# Altium footprint library Connectors SMD.PcbLib: 130 footprints (part 3 of 12)
Each footprint in its own frame and in the unit in brackets; x right, y up, seen from the top. Pads: shape width x height; smd on the part's side, far side on the other; paste and mask are expansions set on the pad; w line width, h text height; cw(c..) or ccw(c..) is an arc to the next point about the centre after c.
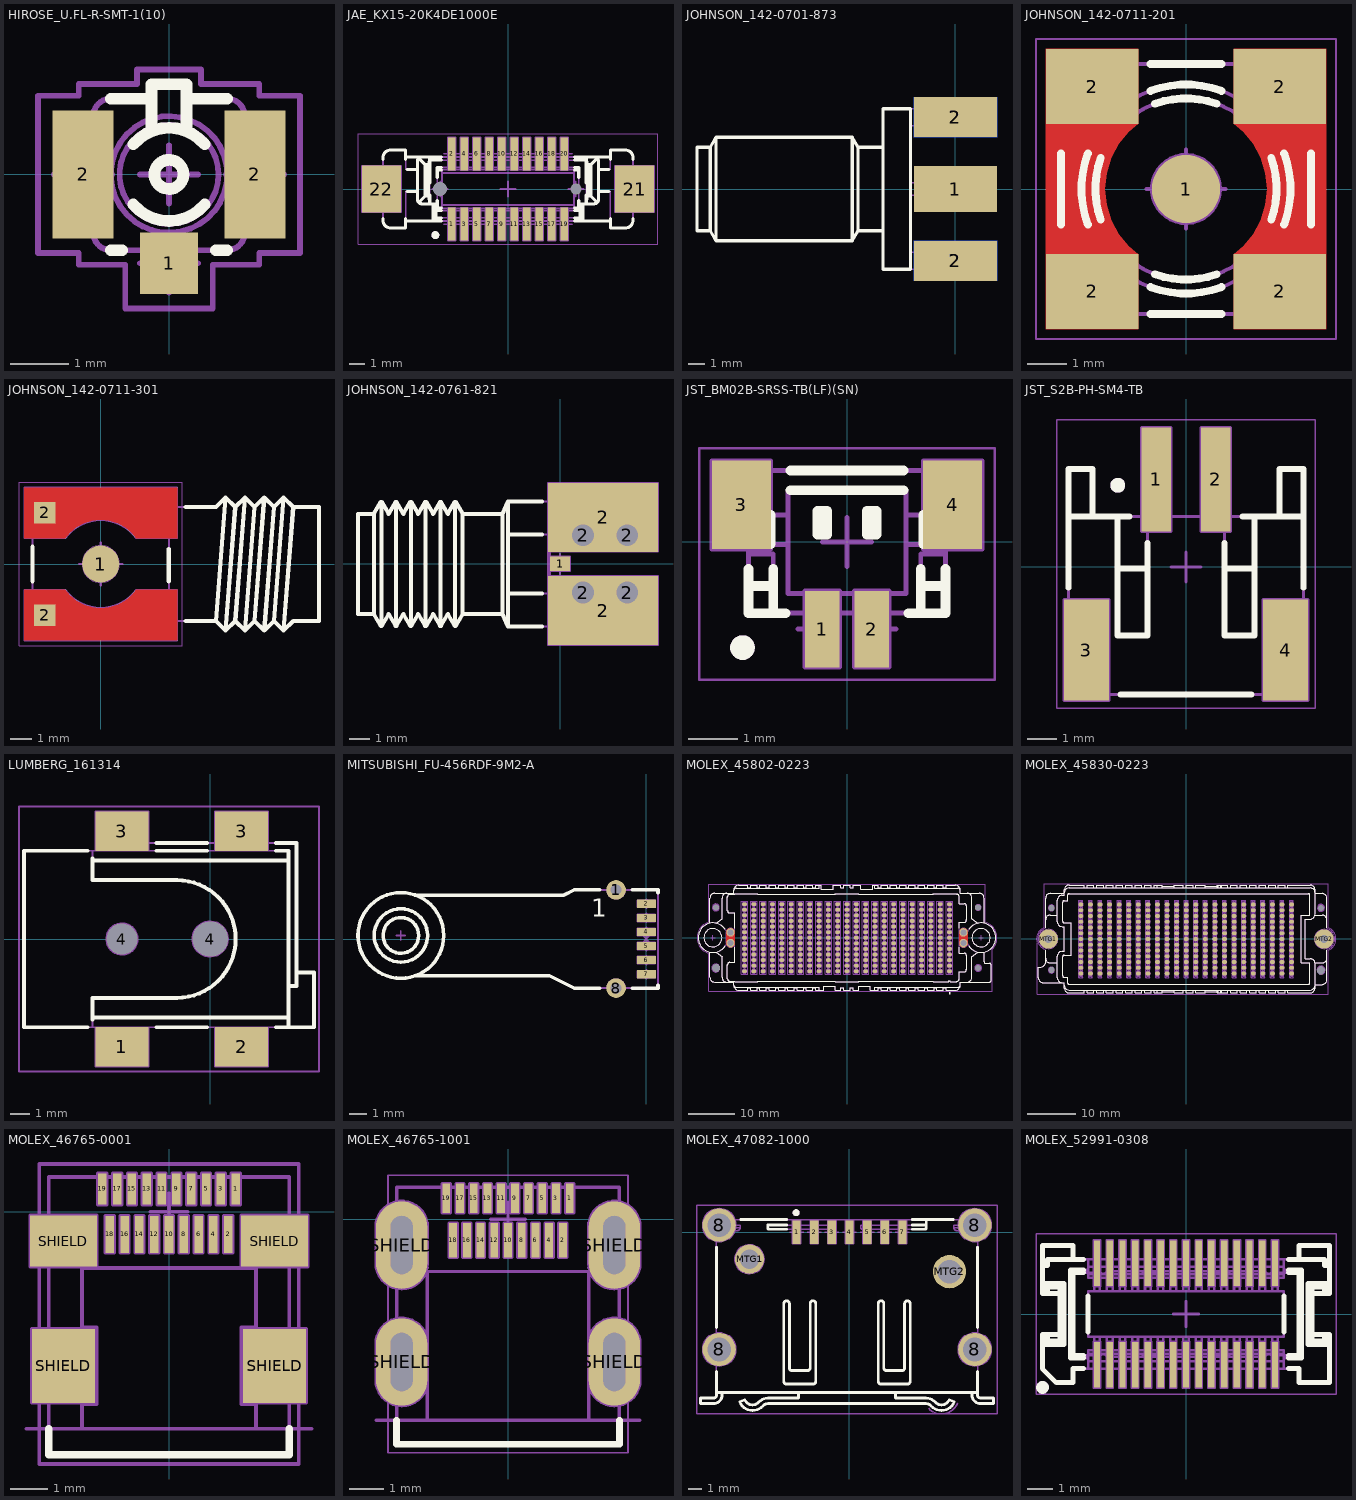
[diagram p2: the footprints below, top view; thin cyan lines are the x and y axes]

## HIROSE_U.FL-R-SMT-1(10) [mm] "Up to 6GHz Ultra Small Surface Mount Male Coaxial Connectors U.FL Series"
height 1.25
pads (3):
  rect 1x1.05 smd: 1(0,-1.525)
  rect 1.05x2.2 smd: 2(-1.475,0) 2(1.475,0)
Top Overlay:
  circle w0.2: c0,0 r0.25
  lines w0.2: -1,-1.3 -0.8,-1.3 ; -1,1.3 -0.3,1.3 ; -0.612,-0.516 ccw(c0,0) 0.612,-0.516 ; -0.612,0.516 cw(c0,0) 0.612,0.516 ; -0.3,0.75 -0.3,1.55 0.3,1.55 0.3,0.75 ; 0.3,1.3 1,1.3 ; 0.8,-1.3 1,-1.3
Mechanical 8:
  lines w0.1: -1.975,0 -1.475,0 ; -1.475,-0.5 -1.475,0 ; -1.475,0.5 -1.475,0 ; -0.975,0 -1.475,0 ; -0.5,-1.525 0,-1.525 ; -0.5,0 0,0 ; 0,-2.025 0,-1.525 ; 0,-1.025 0,-1.525 ; 0,-0.5 0,0 ; 0,0.5 0,0 ; 0.5,-1.525 0,-1.525 ; 0.5,0 0,0 ; 0.975,0 1.475,0 ; 1.475,-0.5 1.475,0 ; 1.475,0.5 1.475,0 ; 1.975,0 1.475,0
Mechanical 14:
  circle w0.1: c0,0 r1
  circle w0.1: c0,0 r0.85
  circle w0.1: c0,0 r0.25
  lines w0.1: -1.3,-0.9 -1.5,-0.9 -1.5,0.9 -1.3,0.9 ; -0.3,-1.3 -0.3,-1.55 0.3,-1.55 0.3,-1.3 ; -0.3,0.954 -0.3,1.55 0.3,1.55 0.3,0.954 ; -0.3,1.3 -1,1.3 ccw(c-1,1) -1.3,1 -1.3,-1 ccw(c-1,-1) -1,-1.3 1,-1.3 ccw(c1,-1) 1.3,-1 1.3,1 ccw(c1,1) 1,1.3 0.3,1.3 ; 1.3,-0.9 1.5,-0.9 1.5,0.9 1.3,0.9
Mechanical 15:
  lines w0.1: 0.75,1.55 1.55,1.55 ; 1.55,1.55 0.55,1.55 0.55,1.8 -0.55,1.8 -0.55,1.55 -1.55,1.55 -1.55,1.35 -2.25,1.35 -2.25,-1.35 -1.55,-1.35 -1.55,-1.55 -0.75,-1.55 -0.75,-2.3 0.75,-2.3 0.75,-1.55 1.55,-1.55 1.55,-1.35 2.25,-1.35 2.25,1.35 1.55,1.35 1.55,1.55
3D body: height 1.25, standoff 0, extent -1.5,-1.55 1.5,1.55

## JAE_KX15-20K4DE1000E [mm] "0.8mm Pitch, 20 Contacts Surface Mount Board to Board & Mezzanine Plug Connector"
height 6.05
pads (24):
  rect 0.5x2.1 smd: 1(-3.6,-2.25) 2(-3.6,2.25) 3(-2.8,-2.25) 4(-2.8,2.25) 5(-2,-2.25) 6(-2,2.25) 7(-1.2,-2.25) 8(-1.2,2.25) 9(-0.4,-2.25) 10(-0.4,2.25) 11(0.4,-2.25) 12(0.4,2.25) 13(1.2,-2.25) 14(1.2,2.25) 15(2,-2.25) 16(2,2.25) 17(2.8,-2.25) 18(2.8,2.25) 19(3.6,-2.25) 20(3.6,2.25)
  rect 2.5x3 smd: 21(8.1,0) 22(-8.1,0)
  round 0.5 hole 0.7 unplated mask+0.1: 23(4.35,0)
  round 0.5 hole 0.9 unplated mask+0.2: 24(-4.35,0)
Top Overlay:
  circle w0.25: c-4.65,-2.95 r0.125
  lines w0.2: -8,-1.9 -8,-2 ccw(c-7.5,-2) -7.5,-2.5 -6.55,-2.5 -6.55,-1.9 ; -8,1.9 -8,2 cw(c-7.5,2) -7.5,2.5 -6.55,2.5 -6.55,1.9 ; -6.55,-2.05 -4.25,-2.05 ; -6.55,2.05 -4.25,2.05 ; -6.45,-0.15 -5.8,-0.15 ; -6.45,1.25 -5.8,1.25 ; -5.712,-0.862 -5.3,-0.45 ; -5.712,1.962 -5.3,1.55 ; -5.5,2.05 ccw(c-5.5,1.75) -5.8,1.75 -5.8,-0.65 ccw(c-5.5,-0.65) -5.5,-0.95 -4.6,-0.95 -4.6,-1.85 ; -5,-0.374 -5,-0.95 -5.1,-0.45 ; -5,0.374 -5,1.85 ; -5,2.05 -5.1,1.55 ; -4.96,2.05 -5,1.85 ; -4.8,-0.95 -4.8,-2.05 -4.6,-1.85 ; -4.525,-0.729 -4.525,-1.375 ; -4.525,0.729 -4.525,1.375 ; -4.25,-1.85 -4.6,-1.85 ; -4.25,-1.375 -4.525,-1.375 ; -4.25,-1.225 -4.502,-1.225 -4.525,-1.375 ; -4.25,1.225 -4.502,1.225 -4.525,1.375 ; -4.25,1.375 -4.525,1.375 ; -4.25,1.85 -5,1.85 ; 4.25,-2.05 6.55,-2.05 ; 4.25,-1.85 4.6,-1.85 ; 4.25,-1.375 4.525,-1.375 ; 4.25,-1.225 4.502,-1.225 4.525,-1.375 ; 4.25,1.225 4.502,1.225 4.525,1.375 ; 4.25,1.375 4.525,1.375 ; 4.25,1.85 5,1.85 ; 4.25,2.05 6.55,2.05 ; 4.525,-0.729 4.525,-1.375 ; 4.525,0.729 4.525,1.375 ; 4.8,-0.95 4.8,-2.05 4.6,-1.85 ; 4.96,2.05 5,1.85 ; 5,-0.374 5,-0.95 5.1,-0.45 ; 5,0.374 5,1.85 ; 5,2.05 5.1,1.55 ; 5.476,2.049 cw(c5.5,1.75) 5.8,1.75 5.8,-0.65 cw(c5.5,-0.65) 5.5,-0.95 4.6,-0.95 4.6,-1.85 ; 5.712,-0.862 5.3,-0.45 ; 5.712,1.962 5.3,1.55 ; 5.8,-0.15 6.45,-0.15 ; 5.8,1.25 6.45,1.25 ; 6.55,-1.9 6.55,-2.5 7.5,-2.5 ccw(c7.5,-2) 8,-2 8,-1.9 ; 6.55,1.9 6.55,2.5 7.5,2.5 cw(c7.5,2) 8,2 8,1.9 ; -5.3,-0.45 -5.3,1.55 ; -5.3,-0.45 -5.1,-0.45 ; -5.3,1.55 -5.1,1.55 ; -5.1,-0.45 -5.1,1.55 ; 5.1,-0.45 5.1,1.55 ; 5.1,-0.45 5.3,-0.45 ; 5.1,1.55 5.3,1.55 ; 5.3,-0.45 5.3,1.55
Mechanical 8:
  drawing of 192 lines, arcs and shapes, not listed
Mechanical 14:
  circle w0.25: c-4.65,-2.95 r0.125
  lines w0.1: -8,-0.95 -8.7,-0.95 -8.7,0.95 -8,0.95 ; -6.55,-2.05 6.55,-2.05 ; -6.55,2.05 6.55,2.05 ; -5.8,-0.15 -6.55,-0.15 -6.55,-2.5 -7.5,-2.5 cw(c-7.5,-2) -8,-2 -8,2 cw(c-7.5,2) -7.5,2.5 -6.55,2.5 -6.55,1.25 -5.8,1.25 ; -5.712,-0.862 -5.3,-0.45 ; -5.712,1.962 -5.3,1.55 ; -5.5,2.05 ccw(c-5.5,1.75) -5.8,1.75 -5.8,-0.65 ccw(c-5.5,-0.65) -5.5,-0.95 -4.6,-0.95 -4.6,-1.85 ; -5,2.05 -5.1,1.55 ; -4.96,2.05 -5,1.85 ; -4.8,-0.95 -4.8,-2.05 -4.6,-1.85 ; -4.225,-1.225 -4.225,1.225 ; -4.225,-1.025 4.225,-1.025 ; -4.225,1.025 4.225,1.025 ; -3.725,-2.05 -3.725,-2.75 -3.475,-2.75 -3.475,-2.05 ; -3.725,2.05 -3.725,2.75 -3.475,2.75 -3.475,2.05 ; -2.925,-2.05 -2.925,-2.75 -2.675,-2.75 -2.675,-2.05 ; -2.925,2.05 -2.925,2.75 -2.675,2.75 -2.675,2.05 ; -2.125,-2.05 -2.125,-2.75 -1.875,-2.75 -1.875,-2.05 ; -2.125,2.05 -2.125,2.75 -1.875,2.75 -1.875,2.05 ; -1.325,-2.05 -1.325,-2.75 -1.075,-2.75 -1.075,-2.05 ; -1.325,2.05 -1.325,2.75 -1.075,2.75 -1.075,2.05 ; -0.525,-2.05 -0.525,-2.75 -0.275,-2.75 -0.275,-2.05 ; -0.525,2.05 -0.525,2.75 -0.275,2.75 -0.275,2.05 ; 0.275,-2.05 0.275,-2.75 0.525,-2.75 0.525,-2.05 ; 0.275,2.05 0.275,2.75 0.525,2.75 0.525,2.05 ; 1.075,-2.05 1.075,-2.75 1.325,-2.75 1.325,-2.05 ; 1.075,2.05 1.075,2.75 1.325,2.75 1.325,2.05 ; 1.875,-2.05 1.875,-2.75 2.125,-2.75 2.125,-2.05 ; 1.875,2.05 1.875,2.75 2.125,2.75 2.125,2.05 ; 2.675,-2.05 2.675,-2.75 2.925,-2.75 2.925,-2.05 ; 2.675,2.05 2.675,2.75 2.925,2.75 2.925,2.05 ; 3.475,-2.05 3.475,-2.75 3.725,-2.75 3.725,-2.05 ; 3.475,2.05 3.475,2.75 3.725,2.75 3.725,2.05 ; 4.225,-1.225 4.225,1.225 ; 4.8,-0.95 4.8,-2.05 4.6,-1.85 ; 4.96,2.05 5,1.85 ; 5,2.05 5.1,1.55 ; 5.476,2.049 cw(c5.5,1.75) 5.8,1.75 5.8,-0.65 cw(c5.5,-0.65) 5.5,-0.95 4.6,-0.95 4.6,-1.85 ; 5.712,-0.862 5.3,-0.45 ; 5.712,1.962 5.3,1.55 ; 5.8,-0.15 6.55,-0.15 6.55,-2.5 7.5,-2.5 ccw(c7.5,-2) 8,-2 8,2 ccw(c7.5,2) 7.5,2.5 6.55,2.5 6.55,1.25 5.8,1.25 ; 8,-0.95 8.7,-0.95 8.7,0.95 8,0.95 ; -5.3,-0.45 -5.3,1.55 ; -5.3,-0.45 -5.1,-0.45 ; -5.3,1.55 -5.1,1.55 ; -5.1,-0.45 -5,-0.95 -5,1.85 ; -5.1,-0.45 -5.1,1.55 ; -5,1.85 5,1.85 ; -4.6,-1.85 4.6,-1.85 ; -4.525,-1.375 -4.502,-1.225 4.502,-1.225 4.525,-1.375 ; -4.525,-1.375 4.525,-1.375 ; -4.525,-1.375 -4.525,1.375 ; -4.525,1.375 -4.502,1.225 4.502,1.225 4.525,1.375 ; -4.525,1.375 4.525,1.375 ; 4.525,-1.375 4.525,1.375 ; 5,1.85 5,-0.95 5.1,-0.45 ; 5.1,-0.45 5.1,1.55 ; 5.1,-0.45 5.3,-0.45 ; 5.1,1.55 5.3,1.55 ; 5.3,-0.45 5.3,1.55
Mechanical 15:
  lines w0.05: -9.6,-3.55 -9.6,3.55 9.6,3.55 9.6,-3.55 -9.6,-3.55
3D body: height 5.75, standoff -0.6, extent -8.7,-2.75 8.7,2.75

## JOHNSON_142-0701-873 [mm] "SMA End Launch Straight Bulkhead Jack Receptacle - Round Contact"
height 8.05
pads (5):
  rect 5x2.794 smd: 1(0,0)
  rect 5x2.4 smd: 2(0,-4.317) 2(0,4.317)
  rect 5x2.4 smd far side: 2(0,-4.317) 2(0,4.317)
Top Overlay:
  lines w0.2: -14.73,-2.5 -15.526,-2.5 -15.526,2.5 -14.73,2.5 ; -5.85,-2.5 -4.35,-2.5 ; -5.85,2.5 -4.35,2.5 ; -14.38,-3.11 -6.2,-3.11 ; -14.38,-3.11 -14.73,-2.51 -14.73,2.51 -14.38,3.11 ; -14.38,-3.11 -14.38,3.11 ; -14.38,3.11 -6.2,3.11 ; -6.2,-3.11 -5.85,-2.51 -5.85,2.51 -6.2,3.11 ; -6.2,-3.11 -6.2,3.11 ; -4.35,-4.825 -4.35,4.825 -2.7,4.825 -2.7,-4.825 -4.35,-4.825
Mechanical 8:
  lines w0.1: -1,-4.317 0,-4.317 ; -1,0 0,0 ; -1,4.317 0,4.317 ; 0,-5.317 0,-4.317 ; 0,-3.317 0,-4.317 ; 0,-1 0,0 ; 0,1 0,0 ; 0,3.317 0,4.317 ; 0,5.317 0,4.317 ; 1,-4.317 0,-4.317 ; 1,0 0,0 ; 1,4.317 0,4.317
Mechanical 14:
  lines w0.1: -14.73,-2.5 -15.526,-2.5 -15.526,2.5 -14.73,2.5 ; -5.85,-2.5 -4.35,-2.5 ; -5.85,2.5 -4.35,2.5 ; -2.7,-3.809 2.05,-3.809 2.05,-4.825 -2.7,-4.825 ; -2.7,-0.381 2.054,-0.381 2.054,0.381 -2.696,0.381 ; -2.7,3.809 2.05,3.809 2.05,4.825 -2.7,4.825 ; -14.38,-3.11 -6.2,-3.11 ; -14.38,-3.11 -14.73,-2.51 -14.73,2.51 -14.38,3.11 ; -14.38,-3.11 -14.38,3.11 ; -14.38,3.11 -6.2,3.11 ; -6.2,-3.11 -5.85,-2.51 -5.85,2.51 -6.2,3.11 ; -6.2,-3.11 -6.2,3.11 ; -2.7,-4.825 -4.35,-4.825 -4.35,4.825 -2.7,4.825 ; -2.7,-4.825 -2.7,4.825
3D body: height 4.48, standoff -3.57, extent -15.526,-4.825 2.054,4.825
3D body: height 5.56, standoff -4.64, extent -8.57,-5.1 -6.35,5.1

## JOHNSON_142-0711-201 [mm] "SMA 50 Ohm Straight Jack Receptacle - Surface Mount"
height 8.84
pads (5):
  round 1.73 smd: 1(0,0)
  rect 2.35x1.9 smd: 2(-2.38,-2.6) 2(-2.38,2.6) 2(2.38,-2.6) 2(2.38,2.6)
Top Layer:
  region: 1.205,-3.555 3.555,-3.555 3.555,3.555 1.205,3.555 1.207,1.655 1.453,1.453 1.709,1.142 1.898,0.786 2.015,0.401 2.055,0 2.015,-0.401 1.898,-0.786 1.709,-1.142 1.453,-1.453 1.207,-1.655 1.205,-1.652
  region: -3.555,-3.555 -1.205,-3.555 -1.207,-1.655 -1.453,-1.453 -1.709,-1.142 -1.898,-0.786 -2.015,-0.401 -2.055,0 -2.015,0.401 -1.898,0.786 -1.709,1.142 -1.453,1.453 -1.207,1.655 -1.205,1.652 -1.205,3.555 -3.555,3.555
Top Overlay:
  lines w0.2: -3.175,-0.905 -3.175,0.905 ; -2.491,-0.905 cw(c0,0) -2.491,0.905 ; -2.162,-0.78 cw(c0,0.005) -2.162,0.79 ; -0.905,-3.175 0.905,-3.175 ; -0.905,-2.491 ccw(c0,0) 0.905,-2.491 ; -0.905,2.491 cw(c0,0) 0.905,2.491 ; -0.905,3.175 0.905,3.175 ; -0.79,-2.162 ccw(c-0.005,0) 0.78,-2.162 ; -0.79,2.162 cw(c-0.005,0) 0.78,2.162 ; 2.162,-0.78 ccw(c0,0.005) 2.162,0.79 ; 2.491,-0.905 ccw(c0,0) 2.491,0.905 ; 3.175,-0.905 3.175,0.905
Top Solder:
  region: -3.655,-3.655 -3.655,-1.105 -1.601,-1.105 -1.606,-1.109 -1.382,-1.382 -1.109,-1.606 -1.105,-1.601 -1.105,-3.655
  region: 1.105,-3.655 1.105,-1.601 1.109,-1.606 1.382,-1.382 1.606,-1.109 1.601,-1.105 3.655,-1.105 3.655,-3.655
  region: -3.655,1.105 -1.601,1.105 -1.606,1.109 -1.382,1.382 -1.109,1.606 -1.105,1.601 -1.105,3.655 -3.655,3.655
  region: 1.109,1.606 1.382,1.382 1.606,1.109 1.601,1.105 3.655,1.105 3.655,3.655 1.105,3.655
Mechanical 8:
  lines w0.1: -3.38,-2.38 -2.38,-2.38 ; -3.38,2.38 -2.38,2.38 ; -2.38,-3.38 -2.38,-2.38 ; -2.38,-1.38 -2.38,-2.38 ; -2.38,1.38 -2.38,2.38 ; -2.38,3.38 -2.38,2.38 ; -1.38,-2.38 -2.38,-2.38 ; -1.38,2.38 -2.38,2.38 ; -1,0 0,0 ; 0,-1 0,0 ; 0,1 0,0 ; 1,0 0,0 ; 1.38,-2.38 2.38,-2.38 ; 1.38,2.38 2.38,2.38 ; 2.38,-3.38 2.38,-2.38 ; 2.38,-1.38 2.38,-2.38 ; 2.38,1.38 2.38,2.38 ; 2.38,3.38 2.38,2.38 ; 3.38,-2.38 2.38,-2.38 ; 3.38,2.38 2.38,2.38 ; -3.175,-3.175 -3.175,-1.585 -1.585,-1.585 -1.585,-3.175 -3.175,-3.175 ; -3.175,1.585 -3.175,3.175 -1.585,3.175 -1.585,1.585 -3.175,1.585 ; 1.585,-3.175 3.175,-3.175 3.175,-1.585 1.585,-1.585 1.585,-3.175 ; 1.585,1.585 3.175,1.585 3.175,3.175 1.585,3.175 1.585,1.585
Mechanical 14:
  circle w0.1: c0,0 r0.635
  circle w0.1: c0,0 r2.65
  circle w0.1: c0,0 r2.3
  lines w0.1: 3.175,-3.175 -3.175,-3.175 -3.175,3.175 3.175,3.175 ; 3.175,-3.175 3.175,3.175 ; 3.175,-3.175 3.175,3.175
Mechanical 15:
  circle w0.1: c0,0 r0.865
  lines w0.05: -3.805,-3.805 -3.805,3.805 3.805,3.805 3.805,-3.805 -3.805,-3.805
3D body: height 8.84, standoff 0, extent -3.175,-3.175 3.175,3.175

## JOHNSON_142-0711-301 [mm] "SMA 50 Ohm Right Angle Jack Receptacle - Surface Mount"
height 8.26
pads (3):
  round 1.73 smd: 1(0,0)
  rect 1x1 smd: 2(-2.6,-2.38) 2(-2.6,2.38)
Top Layer:
  region: 3.555,-3.555 3.555,-1.205 1.655,-1.207 1.453,-1.453 1.142,-1.709 0.786,-1.898 0.401,-2.015 0,-2.055 -0.401,-2.015 -0.786,-1.898 -1.142,-1.709 -1.453,-1.453 -1.655,-1.207 -1.652,-1.205 -3.555,-1.205 -3.555,-3.555
  region: 3.555,1.205 3.555,3.555 -3.555,3.555 -3.555,1.205 -1.655,1.207 -1.453,1.453 -1.142,1.709 -0.786,1.898 -0.401,2.015 0,2.055 0.401,2.015 0.786,1.898 1.142,1.709 1.453,1.453 1.655,1.207 1.652,1.205
Top Overlay:
  lines w0.2: -3.175,-0.805 -3.175,0.805 ; 3.175,-0.805 3.175,0.7 ; 3.955,-2.65 5.365,-2.65 ; 3.955,2.65 5.365,2.65 5.815,3.1 ; 5.365,-2.65 5.815,-3.1 ; 5.365,-2.65 5.815,3.1 ; 5.815,-3.1 6.265,-2.65 ; 5.815,-3.1 6.265,2.65 ; 5.815,3.1 6.265,2.65 ; 6.265,-2.65 6.715,-3.1 ; 6.265,-2.65 6.715,3.1 ; 6.265,2.65 6.715,3.1 ; 6.715,-3.1 7.165,-2.65 ; 6.715,-3.1 7.165,2.65 ; 6.715,3.1 7.165,2.65 ; 7.165,-2.65 7.615,-3.1 ; 7.165,-2.65 7.615,3.1 ; 7.165,2.65 7.615,3.1 ; 7.615,-3.1 8.065,-2.65 ; 7.615,-3.1 8.065,2.65 ; 7.615,3.1 8.065,2.65 ; 8.065,-2.65 8.515,-3.1 ; 8.065,-2.65 8.515,3.1 ; 8.065,2.65 8.515,3.1 ; 8.515,-3.1 8.965,-2.65 10.165,-2.65 10.165,2.65 8.965,2.65 ; 8.515,-3.1 8.965,2.65 ; 8.515,3.1 8.965,2.65
Mechanical 7:
  lines w0.1: -3.555,-3.555 -3.555,-1.205 -1.652,-1.205 ccw(c0,0) 1.652,-1.205 3.555,-1.205 3.555,-3.555 -3.555,-3.555 ; -3.555,1.205 -3.555,3.555 3.555,3.555 3.555,1.205 1.652,1.205 ccw(c0,0) -1.652,1.205 -3.555,1.205
Mechanical 8:
  lines w0.1: -3.38,-2.38 -2.38,-2.38 ; -3.38,2.38 -2.38,2.38 ; -3.175,-1.585 -1.585,-1.585 -1.585,-3.175 ; -3.175,1.585 -1.585,1.585 -1.585,3.175 ; -2.38,-3.38 -2.38,-2.38 ; -2.38,-1.38 -2.38,-2.38 ; -2.38,1.38 -2.38,2.38 ; -2.38,3.38 -2.38,2.38 ; -1.38,-2.38 -2.38,-2.38 ; -1.38,2.38 -2.38,2.38 ; -1,0 0,0 ; 0,-1 0,0 ; 0,1 0,0 ; 1,0 0,0 ; 1.38,-2.38 2.38,-2.38 ; 1.38,2.38 2.38,2.38 ; 1.585,-3.175 1.585,-1.585 3.175,-1.585 ; 1.585,3.175 1.585,1.585 3.175,1.585 ; 2.38,-3.38 2.38,-2.38 ; 2.38,-1.38 2.38,-2.38 ; 2.38,1.38 2.38,2.38 ; 2.38,3.38 2.38,2.38 ; 3.38,-2.38 2.38,-2.38 ; 3.38,2.38 2.38,2.38 ; -3.555,-3.555 -1.205,-3.555 -1.205,-1.652 cw(c0,0) -1.652,-1.205 -3.555,-1.205 -3.555,-3.555 ; -3.555,1.205 -3.555,3.555 -1.205,3.555 -1.205,1.652 ccw(c0,0) -1.652,1.205 -3.555,1.205 ; 1.205,-3.555 1.205,-1.652 ccw(c0,0) 1.652,-1.205 3.555,-1.205 3.555,-3.555 1.205,-3.555 ; 1.205,1.652 cw(c0,0) 1.652,1.205 3.555,1.205 3.555,3.555 1.205,3.555 1.205,1.652
Mechanical 14:
  circle w0.1: c0,0 r0.635
  lines w0.1: 3.175,-2.65 5.365,-2.65 ; 3.175,2.65 5.365,2.65 5.815,3.1 ; -3.175,-3.175 -3.175,3.175 3.175,3.175 3.175,-3.175 ; -3.175,-3.175 3.175,-3.175 ; -3.175,-3.175 3.175,-3.175 ; 5.365,-2.65 5.815,-3.1 ; 5.365,-2.65 5.815,3.1 ; 5.815,-3.1 6.265,-2.65 ; 5.815,-3.1 6.265,2.65 ; 5.815,3.1 6.265,2.65 ; 6.265,-2.65 6.715,-3.1 ; 6.265,-2.65 6.715,3.1 ; 6.265,2.65 6.715,3.1 ; 6.715,-3.1 7.165,-2.65 ; 6.715,-3.1 7.165,2.65 ; 6.715,3.1 7.165,2.65 ; 7.165,-2.65 7.615,-3.1 ; 7.165,-2.65 7.615,3.1 ; 7.165,2.65 7.615,3.1 ; 7.615,-3.1 8.065,-2.65 ; 7.615,-3.1 8.065,2.65 ; 7.615,3.1 8.065,2.65 ; 8.065,-2.65 8.515,-3.1 ; 8.065,-2.65 8.515,3.1 ; 8.065,2.65 8.515,3.1 ; 8.515,-3.1 8.965,-2.65 10.165,-2.65 10.165,2.65 8.965,2.65 ; 8.515,-3.1 8.965,2.65 ; 8.515,3.1 8.965,2.65
Mechanical 15:
  circle w0.05: c0,0 r0.865
  lines w0.05: -3.805,-3.805 -3.805,3.805 3.805,3.805 3.805,-3.805 -3.805,-3.805
3D body: height 8.26, standoff 0, extent -3.175,-3.175 10.165,3.175

## JOHNSON_142-0761-821 [mm] "SMA 50 Ohm End Launch Jack Receptacle"
height 5.53
pads (7):
  rect 1x0.724 smd: 1(0,0)
  round 1.6 hole 1.1: 2(1.15,-1.435) 2(1.15,1.435) 2(3.36,-1.435) 2(3.36,1.435)
  rect 5.5x3.44 smd: 2(2.15,-2.338) 2(2.15,2.328)
Top Overlay:
  lines w0.2: -9.324,-2.5 -10.12,-2.5 -10.12,2.5 -9.324,2.5 -9.324,-2.51 -8.974,-3.11 -8.934,-3.11 -8.584,-2.51 -8.234,-3.11 -8.194,-3.11 -7.844,-2.51 -7.494,-3.11 -7.454,-3.11 -7.104,-2.51 -6.754,-3.11 -6.714,-3.11 -6.364,-2.51 -6.014,-3.11 -5.974,-3.11 -5.624,-2.51 -5.274,-3.11 -5.234,-3.11 -4.884,-2.51 -4.884,2.51 -5.234,3.11 -5.274,3.11 -5.624,2.51 -5.974,3.11 -6.014,3.11 -6.364,2.51 -6.714,3.11 -6.754,3.11 -7.104,2.51 -7.454,3.11 -7.494,3.11 -7.844,2.51 -8.194,3.11 -8.234,3.11 -8.584,2.51 -8.934,3.11 -8.974,3.11 -9.324,2.51 ; -8.954,-3.11 -8.954,3.11 ; -8.214,-3.11 -8.214,3.11 ; -7.474,-3.11 -7.474,3.11 ; -6.734,-3.11 -6.734,3.11 ; -5.994,-3.11 -5.994,3.11 ; -5.254,-3.11 -5.254,3.11 ; -4.884,-2.5 -2.885,-2.5 ; -4.884,2.5 -2.885,2.5 ; -2.62,-1.477 -0.9,-1.477 ; -2.62,1.477 -0.9,1.477 ; -0.9,-3.135 -2.62,-3.135 ; -0.9,3.135 -2.62,3.135 ; -2.885,-2.5 -2.885,2.5 ; -2.885,-2.5 -2.62,-3.135 ; -2.885,2.5 -2.62,3.135 ; -2.62,-3.135 -2.62,3.135
Mechanical 8:
  lines w0.1: -0.6,-0.616 4.9,-0.616 4.9,-4.06 -0.6,-4.06 -0.6,4.04 4.9,4.04 4.9,0.616 -0.6,0.616 ; -0.5,0 0,0 ; 0,-0.5 0,0 ; 0,0.5 0,0 ; 0.5,0 0,0 ; 0.65,-1.435 1.15,-1.435 ; 0.65,1.435 1.15,1.435 ; 1.15,-1.935 1.15,-1.435 ; 1.15,-0.935 1.15,-1.435 ; 1.15,0.935 1.15,1.435 ; 1.15,1.935 1.15,1.435 ; 1.65,-2.338 2.15,-2.338 ; 1.65,-1.435 1.15,-1.435 ; 1.65,1.435 1.15,1.435 ; 1.65,2.328 2.15,2.328 ; 2.15,-2.838 2.15,-2.338 ; 2.15,-1.838 2.15,-2.338 ; 2.15,1.828 2.15,2.328 ; 2.15,2.828 2.15,2.328 ; 2.65,-2.338 2.15,-2.338 ; 2.65,2.328 2.15,2.328 ; 2.86,-1.435 3.36,-1.435 ; 2.86,1.435 3.36,1.435 ; 3.36,-1.935 3.36,-1.435 ; 3.36,-0.935 3.36,-1.435 ; 3.36,0.935 3.36,1.435 ; 3.36,1.935 3.36,1.435 ; 3.86,-1.435 3.36,-1.435 ; 3.86,1.435 3.36,1.435 ; -0.5,-0.362 0.5,-0.362 0.5,0.362 -0.5,0.362 -0.5,-0.362
Mechanical 14:
  lines w0.1: -9.324,-2.5 -10.12,-2.5 -10.12,2.5 -9.324,2.5 -9.324,-2.51 -8.974,-3.11 -8.934,-3.11 -8.584,-2.51 -8.234,-3.11 -8.194,-3.11 -7.844,-2.51 -7.494,-3.11 -7.454,-3.11 -7.104,-2.51 -6.754,-3.11 -6.714,-3.11 -6.364,-2.51 -6.014,-3.11 -5.974,-3.11 -5.624,-2.51 -5.274,-3.11 -5.234,-3.11 -4.884,-2.51 -4.884,2.51 -5.234,3.11 -5.274,3.11 -5.624,2.51 -5.974,3.11 -6.014,3.11 -6.364,2.51 -6.714,3.11 -6.754,3.11 -7.104,2.51 -7.454,3.11 -7.494,3.11 -7.844,2.51 -8.194,3.11 -8.234,3.11 -8.584,2.51 -8.934,3.11 -8.974,3.11 -9.324,2.51 ; -8.954,-3.11 -8.954,3.11 ; -8.214,-3.11 -8.214,3.11 ; -7.474,-3.11 -7.474,3.11 ; -6.734,-3.11 -6.734,3.11 ; -5.994,-3.11 -5.994,3.11 ; -5.254,-3.11 -5.254,3.11 ; -4.884,-2.5 -2.885,-2.5 ; -4.884,2.5 -2.885,2.5 ; -2.62,-1.477 -0.6,-1.477 ; -2.62,1.477 -0.6,1.477 ; -0.6,-3.135 -0.6,3.135 ; -0.6,-0.85 3.95,-0.85 3.95,-3.135 -2.62,-3.135 ; -0.6,-0.6 -0.5,-0.6 -0.5,0.6 -0.6,0.6 ; -0.6,0.85 3.95,0.85 3.95,3.135 -2.62,3.135 ; -0.5,-0.19 0.16,-0.19 0.16,0.19 -0.5,0.19 ; -2.885,-2.5 -2.885,2.5 ; -2.885,-2.5 -2.62,-3.135 ; -2.885,2.5 -2.62,3.135 ; -2.62,-3.135 -2.62,3.135
3D body: height 3.3, standoff -2.92, extent -10.12,-3.135 3.95,3.135

## JST_BM02B-SRSS-TB(LF)(SN) [mm] "1.0mm Pitch Disconnectable Crimp Style Connector, Body 4mm x 2.9mm"
height 4.25
pads (4):
  rect 0.7x1.55 smd: 1(-0.5,-1.775) 2(0.5,-1.775)
  rect 1.2x1.8 smd: 3(-2.15,0.75) 4(2.15,0.75)
Top Overlay:
  circle w0.25: c-2.125,-2.15 r0.125
  lines w0.2: -2,-0.9 -1.5,-0.9 ; -2,-0.55 -2,-1.45 -1.25,-1.45 ; -1.55,-0.05 -1.55,0.55 ; -1.5,-1.45 -1.5,-0.55 ; -1.15,1.05 1.15,1.05 ; -1.15,1.45 1.15,1.45 ; -0.6,0.28 -0.4,0.28 ; 0.4,0.28 0.6,0.28 ; 1.25,-1.45 2,-1.45 2,-0.55 ; 1.5,-1.45 1.5,-0.55 ; 1.5,-0.9 2,-0.9 ; 1.55,-0.05 1.55,0.55 ; -0.6,0.15 -0.4,0.15 -0.4,0.63 -0.6,0.63 -0.6,0.15 ; 0.4,0.15 0.6,0.15 0.6,0.63 0.4,0.63 0.4,0.15
Mechanical 8:
  lines w0.1: -2.65,0.75 -2.15,0.75 ; -2.15,0.25 -2.15,0.75 ; -2.15,1.25 -2.15,0.75 ; -1.65,0.75 -2.15,0.75 ; -1,-1.775 -0.5,-1.775 ; -0.5,-2.275 -0.5,-1.775 ; -0.5,-1.275 -0.5,-1.775 ; -0.5,0 0,0 ; 0,-0.5 0,0 ; 0,0.5 0,0 ; 0.5,-2.275 0.5,-1.775 ; 0.5,-1.275 0.5,-1.775 ; 0.5,0 0,0 ; 1,-1.775 0.5,-1.775 ; 1.65,0.75 2.15,0.75 ; 2.15,0.25 2.15,0.75 ; 2.15,1.25 2.15,0.75 ; 2.65,0.75 2.15,0.75 ; -2.75,-0.15 -2.75,1.65 -1.55,1.65 -1.55,-0.15 -2.75,-0.15 ; -0.85,-2.55 -0.85,-1 -0.15,-1 -0.15,-2.55 -0.85,-2.55 ; 0.15,-2.55 0.15,-1 0.85,-1 0.85,-2.55 0.15,-2.55 ; 1.55,-0.15 1.55,1.65 2.75,1.65 2.75,-0.15 1.55,-0.15
Mechanical 14:
  circle w0.25: c-2.125,-2.15 r0.125
  lines w0.1: -2,-0.9 -1.5,-0.9 ; -2,-0.25 -1.5,-0.25 -1.5,-1.45 ; -1.2,-0.05 -1.55,-0.05 -1.55,0.55 -1.2,0.55 ; -0.6,-1.45 -0.6,-2.15 -0.4,-2.15 -0.4,-1.45 ; -0.6,0.28 -0.4,0.28 ; 0.4,-1.45 0.4,-2.15 0.6,-2.15 0.6,-1.45 ; 0.4,0.28 0.6,0.28 ; 1.2,-0.05 1.55,-0.05 1.55,0.55 1.2,0.55 ; 1.5,-1.45 1.5,-0.25 2,-0.25 ; 1.5,-0.9 2,-0.9 ; -2,-1.45 -2,1.45 2,1.45 2,-1.45 -2,-1.45 ; -1.2,-1.05 -1.2,1.05 1.2,1.05 1.2,-1.05 -1.2,-1.05 ; -0.6,0.15 -0.4,0.15 -0.4,0.63 -0.6,0.63 -0.6,0.15 ; 0.4,0.15 0.6,0.15 0.6,0.63 0.4,0.63 0.4,0.15
Mechanical 15:
  lines w0.05: -3,-2.8 3,-2.8 3,1.9 -3,1.9 -3,-2.8
3D body: height 4.32, standoff 0, extent -2,-2.15 2,1.45

## JST_S2B-PH-SM4-TB [mm] "2.0mm Pitch Disconnectable Crimp Style Connector, Body 7.9mm x 8.6mm"
height 5.5
pads (4):
  rect 1x3.5 smd: 1(-1,2.95) 2(1,2.95)
  rect 1.5x3.4 smd: 3(-3.35,-2.8) 4(3.35,-2.8)
Top Overlay:
  circle w0.25: c-2.3,2.75 r0.125
  lines w0.2: -3.95,-0.7 -3.95,3.3 -3.15,3.3 -3.15,1.7 ; -3.95,1.7 -1.9,1.7 ; -2.3,-0.05 -1.3,-0.05 ; -2.3,1.7 -2.3,-2.3 -1.3,-2.3 -1.3,0.8 ; -2.2,-4.3 2.2,-4.3 ; 1.3,-0.05 2.3,-0.05 ; 1.3,0.8 1.3,-2.3 2.3,-2.3 2.3,1.7 ; 1.9,1.7 3.95,1.7 ; 3.15,1.7 3.15,3.3 3.95,3.3 3.95,-0.7
Mechanical 8:
  lines w0.1: -3.85,-2.8 -3.35,-2.8 ; -3.35,-3.3 -3.35,-2.8 ; -3.35,-2.3 -3.35,-2.8 ; -2.85,-2.8 -3.35,-2.8 ; -1.5,2.95 -1,2.95 ; -1,2.45 -1,2.95 ; -1,3.45 -1,2.95 ; -0.5,0 0,0 ; -0.5,2.95 -1,2.95 ; 0,-0.5 0,0 ; 0,0.5 0,0 ; 0.5,0 0,0 ; 0.5,2.95 1,2.95 ; 1,2.45 1,2.95 ; 1,3.45 1,2.95 ; 1.5,2.95 1,2.95 ; 2.85,-2.8 3.35,-2.8 ; 3.35,-3.3 3.35,-2.8 ; 3.35,-2.3 3.35,-2.8 ; 3.85,-2.8 3.35,-2.8 ; -4.1,-4.5 -4.1,-1.1 -2.6,-1.1 -2.6,-4.5 -4.1,-4.5 ; -1.5,1.2 -0.5,1.2 -0.5,4.7 -1.5,4.7 -1.5,1.2 ; 0.5,1.2 1.5,1.2 1.5,4.7 0.5,4.7 0.5,1.2 ; 2.6,-4.5 2.6,-1.1 4.1,-1.1 4.1,-4.5 2.6,-4.5
Mechanical 14:
  circle w0.25: c-2.3,2.75 r0.125
  lines w0.1: -3.95,1.7 3.95,1.7 ; -3.45,-3.5 -3.45,-4.3 3.45,-4.3 3.45,-3.5 ; -3.15,1.7 -3.15,3.3 -3.95,3.3 -3.95,-3.5 -3.05,-3.5 -3.05,-4.3 ; -2.3,-0.05 -1.3,-0.05 ; -2.3,1.7 -2.3,-2.3 -1.3,-2.3 -1.3,1.7 ; -1.25,1.7 -1.25,4.3 -0.75,4.3 -0.75,1.7 ; 0.75,1.7 0.75,4.3 1.25,4.3 1.25,1.7 ; 1.3,-0.05 2.3,-0.05 ; 1.3,1.7 1.3,-2.3 2.3,-2.3 2.3,1.7 ; 3.05,-4.3 3.05,-3.5 3.95,-3.5 3.95,3.3 3.15,3.3 3.15,1.7
Mechanical 15:
  lines w0.05: -4.35,-4.75 4.35,-4.75 4.35,4.95 -4.35,4.95 -4.35,-4.75
3D body: height 5.6, standoff 0, extent -3.95,-4.3 3.95,4.3
